# Altium footprint library Разъемы.PcbLib: 291 footprints (part 10 of 19)
Each footprint in its own frame and in the unit in brackets; x right, y up, seen from the top. Pads: shape width x height; smd on the part's side, far side on the other; paste and mask are expansions set on the pad; w line width, h text height; cw(c..) or ccw(c..) is an arc to the next point about the centre after c.
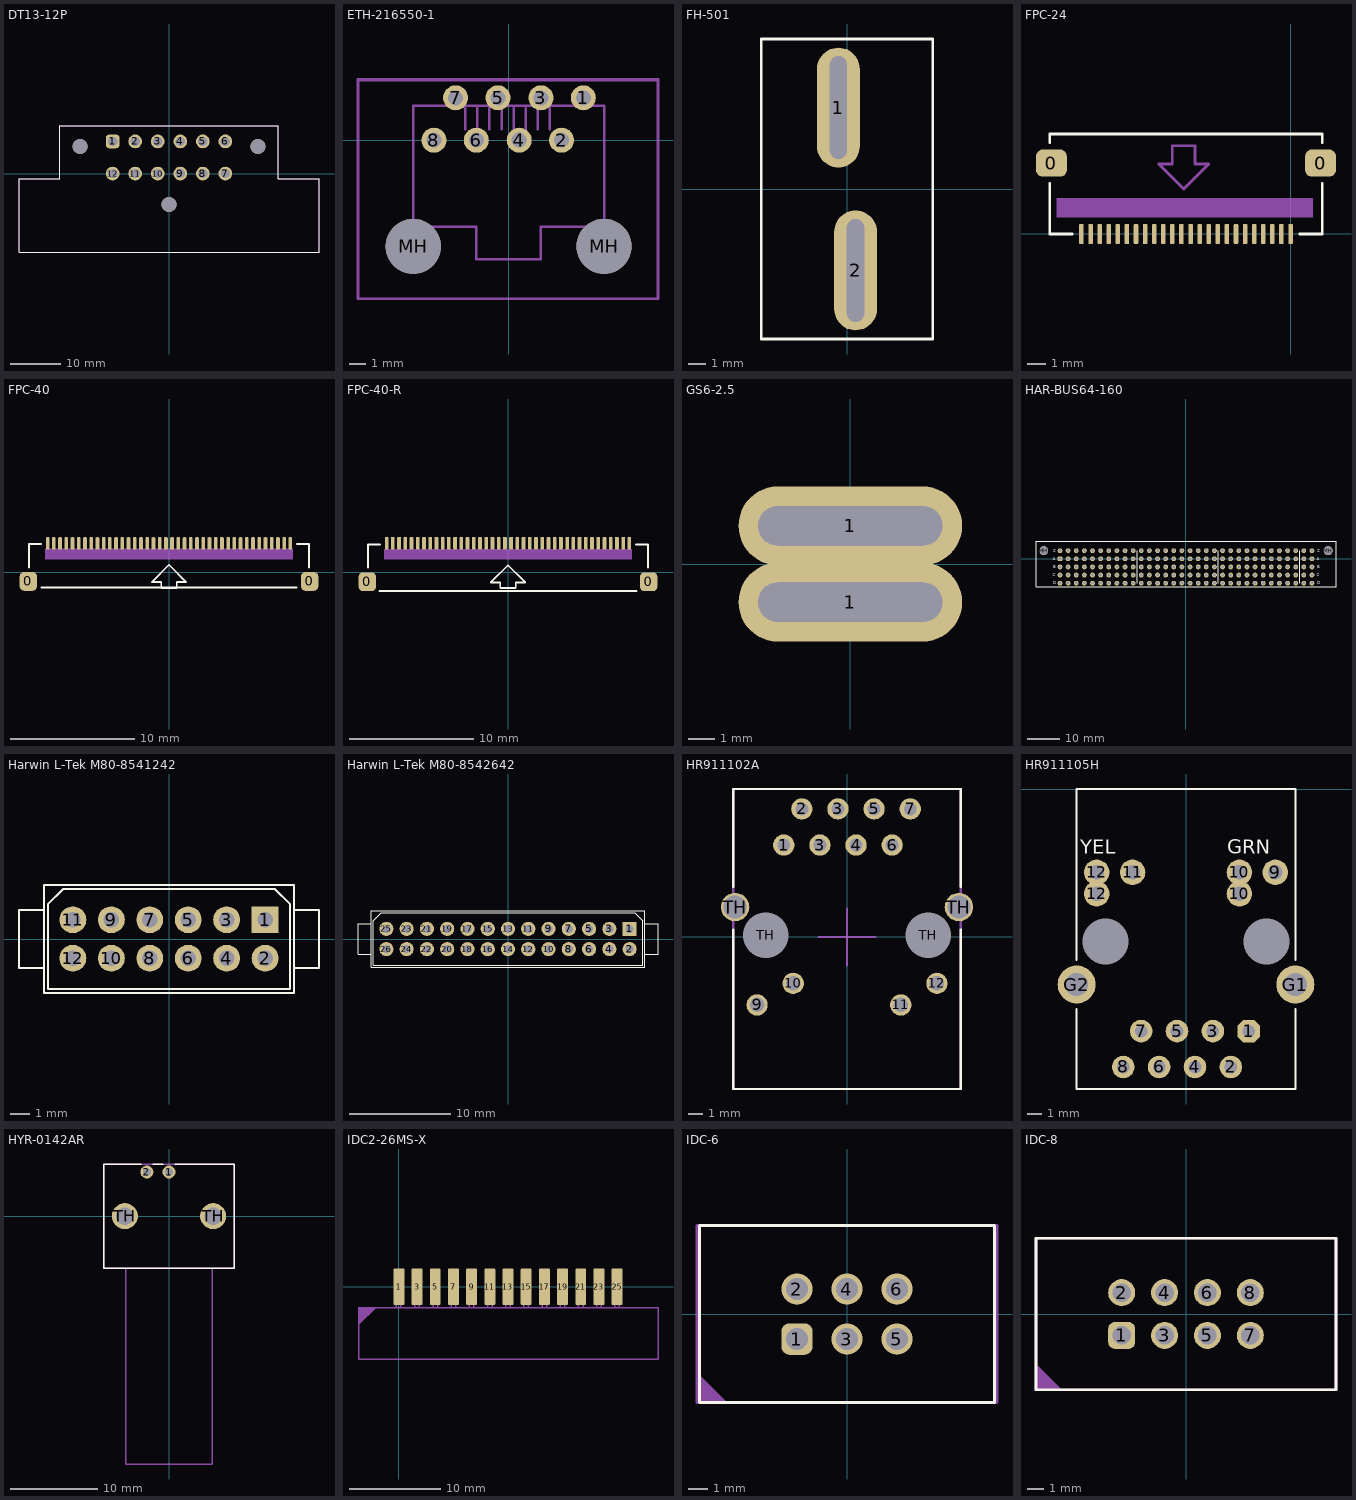
[diagram p9: the footprints below, top view; thin cyan lines are the x and y axes]

## DT13-12P [mm]
pads (15):
  rrect50% 2.715x2.715 hole 1.81: 1(-11.115,6.35)
  round 2.715 hole 1.81: 2(-6.67,6.35) 3(-2.225,6.35) 4(2.225,6.35) 5(6.67,6.35) 6(11.115,6.35) 7(11.115,0) 8(6.67,0) 9(2.225,0) 10(-2.225,0) 11(-6.67,0) 12(-11.115,0)
  round 2.99 hole 2.99 unplated: ""(-17.54,5.34) ""(0,-6.1) ""(17.54,5.34)
Top Overlay:
  lines w0.15: -29.605,-15.49 -29.605,-1 -21.605,-1 -21.605,9.4 21.605,9.4 21.605,-1 29.605,-1 29.605,-15.49 20.28,-15.49 -20.28,-15.49 -29.605,-15.49
  text "." at -11.521,10.029 h0.1
Top Courtyard:
  lines w0.127: -29.605,-15.49 -29.605,-1 -21.605,-1 -21.605,9.4 21.605,9.4 21.605,-1 29.605,-1 29.605,-15.49 20.28,-15.49 -20.28,-15.49 -29.605,-15.49
Top Designator:
  text ".Designator" at -3.999,-10.153 h0.8
3D body "c-dt13-12pb-d-3d.stp": height 33.65, standoff -4.98, extent -29.577,-30.312 29.605,9.312

## ETH-216550-1 [mm]
pads (10):
  round 1.5 hole 0.9: 1(4.475,2.54) 2(3.175,0) 3(1.935,2.54) 4(0.635,0) 5(-0.635,2.54) 6(-1.935,0) 7(-3.175,2.54) 8(-4.475,0)
  round 3.3 hole 3.3 unplated: MH(-5.715,-6.36) MH(5.715,-6.36)
Top Designator:
  text ".Designator" at -4.036,-3.217 h0.8
Mechanical 29:
  lines w0.15: -2.6,0.65 -2.6,1.925 ; -1.875,0.65 -1.875,1.925 ; -1.15,0.65 -1.15,1.925 ; -0.425,0.65 -0.425,1.925 ; 0.3,0.65 0.3,1.925 ; 1.025,0.65 1.025,1.925 ; 1.75,0.65 1.75,1.925 ; 2.475,0.65 2.475,1.925 ; -9.025,-9.5 8.95,-9.5 ; -9.025,-9.5 -9.025,3.6 8.95,3.6 8.95,-9.5 ; -9.025,-9.5 8.95,-9.5 ; -9.025,-9.5 -9.025,3.65 8.95,3.65 8.95,-9.5 ; -5.715,-5.2 -1.935,-5.2 -1.935,-7.125 1.935,-7.125 1.935,-5.2 5.715,-5.2 5.715,2.05 -5.715,2.05 -5.715,-5.2
  text ".Designator" at -3.5,-2.8 h1
3D body "c-216550-1.STEP": height 16.5, standoff -3.1, extent -9.05,-9.625 8.95,3.075

## FH-501 [mm]
pads (2):
  oval 2.5x7 hole 6 slot 1 at 0 deg: 1(-0.5,4.75) 2(0.5,-4.75)
Top Overlay:
  lines w0.15: -5,-8.75 -5,8.75 5,8.75 5,-8.75 -5,-8.75
Top Designator:
  text ".Designator" at -3.999,-0.017 h0.8
3D body "FH-501.stp": height 15, standoff -7, extent -5,-18.5 5,19

## FPC-24 [mm]
pads (26):
  rrect50% 1.7x1.5 smd: 0(-13.15,3.9) 0(1.65,3.9)
  rrect50% 0.25x1.1 smd: 1(0,0) 2(-0.5,0) 3(-1,0) 4(-1.5,0) 5(-2,0) 6(-2.5,0) 7(-3,0) 8(-3.5,0) 9(-4,0) 10(-4.5,0) 11(-5,0) 12(-5.5,0) 13(-6,0) 14(-6.5,0) 15(-7,0) 16(-7.5,0) 17(-8,0) 18(-8.5,0) 19(-9,0) 20(-9.5,0) 21(-10,0) 22(-10.5,0) 23(-11,0) 24(-11.5,0)
Top Overlay:
  lines w0.15: -13.25,2.773 -13.25,0 -12.002,0 ; -13.25,5.027 -13.25,5.5 1.75,5.5 1.75,5.027 ; 0.502,0 1.75,0 1.75,2.773
  text "." at 0.75,-0.75 h0.1
Mechanical 29:
  rectangle: -12.875,0.9 1.225,1.975
  lines w0.15: -7.25,3.85 -6.5,3.85 ; -7.25,3.85 -5.875,2.475 ; -7.25,3.85 -6.5,3.85 ; -7.25,3.85 -5.875,2.475 ; -6.5,3.85 -6.5,4.85 ; -6.5,3.85 -6.5,4.85 ; -6.5,4.85 -5.25,4.85 ; -6.5,4.85 -5.25,4.85 ; -5.875,2.475 -4.5,3.85 ; -5.875,2.475 -4.5,3.85 ; -5.25,3.85 -4.5,3.85 ; -5.25,3.85 -5.25,4.85 ; -5.25,3.85 -4.5,3.85 ; -5.25,3.85 -5.25,4.85

## FPC-40 [mm]
pads (42):
  rrect50% 1.4x1.5 smd: 0(-11.3,-0.75) 0(11.3,-0.75)
  rrect50% 0.3x1 smd: 1(-9.75,2.3) 2(-9.25,2.3) 3(-8.75,2.3) 4(-8.25,2.3) 5(-7.75,2.3) 6(-7.25,2.3) 7(-6.75,2.3) 8(-6.25,2.3) 9(-5.75,2.3) 10(-5.25,2.3) 11(-4.75,2.3) 12(-4.25,2.3) 13(-3.75,2.3) 14(-3.25,2.3) 15(-2.75,2.3) 16(-2.25,2.3) 17(-1.75,2.3) 18(-1.25,2.3) 19(-0.75,2.3) 20(-0.25,2.3) 21(0.25,2.3) 22(0.75,2.3) 23(1.25,2.3) 24(1.75,2.3) 25(2.25,2.3) 26(2.75,2.3) 27(3.25,2.3) 28(3.75,2.3) 29(4.25,2.3) 30(4.75,2.3) 31(5.25,2.3) 32(5.75,2.3) 33(6.25,2.3) 34(6.75,2.3) 35(7.25,2.3) 36(7.75,2.3) 37(8.25,2.3) 38(8.75,2.3) 39(9.25,2.3) 40(9.75,2.3)
Top Overlay:
  lines w0.15: -11.25,0.377 -11.25,2.25 -10.277,2.25 ; -10.23,-1.25 10.23,-1.25 ; 10.277,2.25 11.25,2.25 11.25,0.377 ; -1.375,-0.8 0,0.575 ; -1.375,-0.8 -0.625,-0.8 ; -1.375,-0.8 -0.625,-0.8 ; -1.375,-0.8 0,0.575 ; -0.625,-0.8 -0.625,-1.25 0.625,-1.25 0.625,-0.8 ; -0.625,-0.8 -0.625,-1.275 0.625,-1.275 0.625,-0.8 ; 0,0.575 1.375,-0.8 ; 0,0.575 1.375,-0.8 ; 0.625,-0.8 1.375,-0.8 ; 0.625,-0.8 1.375,-0.8
  text "." at -10.5,2.75 h0.1
Mechanical 29:
  region: 9.95,1.9 -9.975,1.9 -9.975,1.025 9.95,1.025
3D body "FPC-40.STEP": height 1.2, standoff -0.02, extent -11.025,-0.95 10.975,2.05

## FPC-40-R [mm]
pads (42):
  rrect50% 1.4x1.5 smd: 0(-11.3,-0.75) 0(11.3,-0.75)
  rrect50% 0.3x1 smd: 1(9.75,2.35) 2(9.25,2.35) 3(8.75,2.35) 4(8.25,2.35) 5(7.75,2.35) 6(7.25,2.35) 7(6.75,2.35) 8(6.25,2.35) 9(5.75,2.35) 10(5.25,2.35) 11(4.75,2.35) 12(4.25,2.35) 13(3.75,2.35) 14(3.25,2.35) 15(2.75,2.35) 16(2.25,2.35) 17(1.75,2.35) 18(1.25,2.35) 19(0.75,2.35) 20(0.25,2.35) 21(-0.25,2.35) 22(-0.75,2.35) 23(-1.25,2.35) 24(-1.75,2.35) 25(-2.25,2.35) 26(-2.75,2.35) 27(-3.25,2.35) 28(-3.75,2.35) 29(-4.25,2.35) 30(-4.75,2.35) 31(-5.25,2.35) 32(-5.75,2.35) 33(-6.25,2.35) 34(-6.75,2.35) 35(-7.25,2.35) 36(-7.75,2.35) 37(-8.25,2.35) 38(-8.75,2.35) 39(-9.25,2.35) 40(-9.75,2.35)
Top Overlay:
  lines w0.15: -11.25,0.377 -11.25,2.25 -10.277,2.25 ; -10.313,-1.5 10.313,-1.5 ; 10.277,2.25 11.25,2.25 11.25,0.377 ; -1.375,-0.8 0,0.575 ; -1.375,-0.8 0,0.575 ; -1.375,-0.8 -0.625,-0.8 ; -1.375,-0.8 -0.625,-0.8 ; -0.625,-0.8 -0.625,-1.25 0.625,-1.25 0.625,-0.8 ; -0.625,-0.8 -0.625,-1.275 0.625,-1.275 0.625,-0.8 ; 0,0.575 1.375,-0.8 ; 0,0.575 1.375,-0.8 ; 0.625,-0.8 1.375,-0.8 ; 0.625,-0.8 1.375,-0.8
  text "." at 10.5,3 h0.1
Mechanical 29:
  region: 9.95,1.9 -9.975,1.9 -9.975,1.025 9.95,1.025
3D body "FPC-40.STEP": height 1.2, standoff -0.02, extent -11.025,-0.95 10.975,2.05

## GS6-2.5 [mm]
pads (2):
  oval 8.5x3 hole 1.5 slot 7 at 0 deg: 1(0,-1.45) 1(0,1.45)
Top Designator:
  text ".Designator" at -10.073,-0.266 h0.8
Multi-Layer:
  pour cut-out: -4.5,3 -3,3 -3,-3 -4.5,-3
3D body "GS6-2.5.STEP": height 1.15, standoff -2.75, extent -16.5,-5 2.5,5

## HAR-BUS64-160 [mm] "HAR-BUS64-160"
pads (162):
  rrect50% 1.5x1.5 hole 0.9: A1(-39.37,0)
  round 1.5 hole 0.9: A2(-36.83,0) A3(-34.29,0) A4(-31.75,0) A5(-29.21,0) A6(-26.67,0) A7(-24.13,0) A8(-21.59,0) A9(-19.05,0) A10(-16.51,0) A11(-13.97,0) A12(-11.43,0) A13(-8.89,0) A14(-6.35,0) A15(-3.81,0) A16(-1.27,0) A17(1.27,0) A18(3.81,0) A19(6.35,0) A20(8.89,0) A21(11.43,0) A22(13.97,0) A23(16.51,0) A24(19.05,0) A25(21.59,0) A26(24.13,0) A27(26.67,0) A28(29.21,0) A29(31.75,0) A30(34.29,0) A31(36.83,0) A32(39.37,0) B1(-39.37,-2.54) B2(-36.83,-2.54) B3(-34.29,-2.54) B4(-31.75,-2.54) B5(-29.21,-2.54) B6(-26.67,-2.54) B7(-24.13,-2.54) B8(-21.59,-2.54) B9(-19.05,-2.54) B10(-16.51,-2.54) B11(-13.97,-2.54) B12(-11.43,-2.54) B13(-8.89,-2.54) B14(-6.35,-2.54) B15(-3.81,-2.54) B16(-1.27,-2.54) B17(1.27,-2.54) B18(3.81,-2.54) B19(6.35,-2.54) B20(8.89,-2.54) B21(11.43,-2.54) B22(13.97,-2.54) B23(16.51,-2.54) B24(19.05,-2.54) B25(21.59,-2.54) B26(24.13,-2.54) B27(26.67,-2.54) B28(29.21,-2.54) B29(31.75,-2.54) B30(34.29,-2.54) B31(36.83,-2.54) B32(39.37,-2.54) C1(-39.37,-5.08) C2(-36.83,-5.08) C3(-34.29,-5.08) C4(-31.75,-5.08) C5(-29.21,-5.08) C6(-26.67,-5.08) C7(-24.13,-5.08) C8(-21.59,-5.08) C9(-19.05,-5.08) C10(-16.51,-5.08) C11(-13.97,-5.08) C12(-11.43,-5.08) C13(-8.89,-5.08) C14(-6.35,-5.08) C15(-3.81,-5.08) C16(-1.27,-5.08) C17(1.27,-5.08) C18(3.81,-5.08) C19(6.35,-5.08) C20(8.89,-5.08) C21(11.43,-5.08) C22(13.97,-5.08) C23(16.51,-5.08) C24(19.05,-5.08) C25(21.59,-5.08) C26(24.13,-5.08) C27(26.67,-5.08) C28(29.21,-5.08) C29(31.75,-5.08) C30(34.29,-5.08) C31(36.83,-5.08) C32(39.37,-5.08) D1(-39.37,-7.62) D2(-36.83,-7.62) D3(-34.29,-7.62) D4(-31.75,-7.62) D5(-29.21,-7.62) D6(-26.67,-7.62) D7(-24.13,-7.62) D8(-21.59,-7.62) D9(-19.05,-7.62) D10(-16.51,-7.62) D11(-13.97,-7.62) D12(-11.43,-7.62) D13(-8.89,-7.62) D14(-6.35,-7.62) D15(-3.81,-7.62) D16(-1.27,-7.62) D17(1.27,-7.62) D18(3.81,-7.62) D19(6.35,-7.62) D20(8.89,-7.62) D21(11.43,-7.62) D22(13.97,-7.62) D23(16.51,-7.62) D24(19.05,-7.62) D25(21.59,-7.62) D26(24.13,-7.62) D27(26.67,-7.62) D28(29.21,-7.62) D29(31.75,-7.62) D30(34.29,-7.62) D31(36.83,-7.62) D32(39.37,-7.62) Z1(-39.37,2.54) Z2(-36.83,2.54) Z3(-34.29,2.54) Z4(-31.75,2.54) Z5(-29.21,2.54) Z6(-26.67,2.54) Z7(-24.13,2.54) Z8(-21.59,2.54) Z9(-19.05,2.54) Z10(-16.51,2.54) Z11(-13.97,2.54) Z12(-11.43,2.54) Z13(-8.89,2.54) Z14(-6.35,2.54) Z15(-3.81,2.54) Z16(-1.27,2.54) Z17(1.27,2.54) Z18(3.81,2.54) Z19(6.35,2.54) Z20(8.89,2.54) Z21(11.43,2.54) Z22(13.97,2.54) Z23(16.51,2.54) Z24(19.05,2.54) Z25(21.59,2.54) Z26(24.13,2.54) Z27(26.67,2.54) Z28(29.21,2.54) Z29(31.75,2.54) Z30(34.29,2.54) Z31(36.83,2.54) Z32(39.37,2.54)
  round 2.8 hole 2.8 unplated mask+0.102: MH(-44.45,2.54) MH(44.45,2.54)
Top Overlay:
  lines w0.15: -15.24,-7.62 -15.24,2.54 ; 10.16,-7.62 10.16,2.54 ; 35.56,-7.62 35.56,2.54 ; -46.87,-8.75 -46.87,5.5 46.88,5.5 46.88,-8.75 -46.87,-8.75
  text "Z" at 40.95,2.05 h0.9
  text "D" at 40.95,-7.95 h0.9
  text "C" at 40.929,-5.45 h0.9
  text "B" at 40.95,-2.95 h0.9
  text "A" at 40.907,-0.45 h0.9
  text "Z" at -41.55,2.05 h0.9
  text "D" at -41.55,-7.95 h0.9
  text "C" at -41.571,-5.45 h0.9
  text "B" at -41.55,-2.95 h0.9
  text "A" at -41.593,-0.45 h0.9
  text "." at -40,-9.5 h0.1
Top Designator:
  text ".Designator" at -4.014,1.129 h0.8
3D body "СНП350-160ВП31.STEP": height 9.5, standoff -2.82, extent -47.015,-7.873 46.985,12.801

## Harwin L-Tek M80-8541242 [mm]
height 5.56
pads (12):
  rect 1.4x1.4 hole 0.8: 1(5,1)
  round 1.4 hole 0.8: 2(5,-1) 3(3,1) 4(3,-1) 5(1,1) 6(1,-1) 7(-1,1) 8(-1,-1) 9(-3,1) 10(-3,-1) 11(-5,1) 12(-5,-1)
Top Overlay:
  lines w0.1: -6.5,-1.5 -7.8,-1.5 -7.8,1.5 -6.5,1.5 ; 6.5,-1.5 7.8,-1.5 7.8,1.5 6.5,1.5 ; -6.5,-2.8 -6.5,2.8 6.5,2.8 6.5,-2.8 -6.5,-2.8 ; -6.3,-2.6 6.3,-2.6 6.3,1.8 5.5,2.6 -5.5,2.6 -6.3,1.8 -6.3,-2.6

## Harwin L-Tek M80-8542642 [mm]
height 5.56
pads (26):
  rect 1.4x1.4 hole 0.8: 1(12,1)
  round 1.4 hole 0.8: 2(12,-1) 3(10,1) 4(10,-1) 5(8,1) 6(8,-1) 7(6,1) 8(6,-1) 9(4,1) 10(4,-1) 11(2,1) 12(2,-1) 13(0,1) 14(0,-1) 15(-2,1) 16(-2,-1) 17(-4,1) 18(-4,-1) 19(-6,1) 20(-6,-1) 21(-8,1) 22(-8,-1) 23(-10,1) 24(-10,-1) 25(-12,1) 26(-12,-1)
Top Overlay:
  lines w0.1: -13.5,-1.5 -14.8,-1.5 -14.8,1.5 -13.5,1.5 ; 13.5,-1.5 14.8,-1.5 14.8,1.5 13.5,1.5 ; -13.5,-2.8 13.5,-2.8 13.5,2.8 -13.5,2.8 -13.5,-2.8 ; -13.3,-2.6 -13.3,1.8 -12.5,2.6 12.5,2.6 13.3,1.8 13.3,-2.6 -13.3,-2.6

## HR911102A [mm]
height 14
pads (16):
  round 1.5 hole 0.9: 1(-4.445,6.46) 2(-3.175,9) 3(-1.905,6.46) 3(-0.635,9) 4(0.635,6.46) 5(1.905,9) 6(3.175,6.46) 7(4.445,9)
  round 1.5 hole 1.02: 9(-6.325,-4.79) 10(-3.785,-3.27) 11(3.785,-4.79) 12(6.325,-3.27)
  round 2 hole 1.6: TH(-7.875,2.1) TH(7.875,2.1)
  round 1.5 hole 3.2 unplated: TH(-5.715,0.11) TH(5.715,0.11)
Top Overlay:
  lines w0.15: -8,0.5 -8,-10.7 8,-10.7 8,0.5 ; -8,3.5 -8,10.4 8,10.4 8,3.5
Top Designator:
  text ".Designator" at -3.999,-0.479 h0.8
Mechanical 15:
  lines w0.15: -2,0 2,0 ; 0,-2 0,2
Mechanical 29:
  lines w0.15: -8,-10.7 8,-10.7 8,10.4 -8,10.4 -8,-10.7
  text ".Designator" at -3.5,-0.8 h1
3D body: height 4, standoff 1.5, extent 3,-10.9 6.5,-10.4
3D body: height 4, standoff 1.5, extent -6.5,-10.9 -3,-10.4
3D body: height 14, standoff 0.5, extent -8.075,-10.775 8.075,10.475

## HR911105H [mm] "TRJ0011GBNL -- CONN RJ45  WITH MAGNETIC AND LEDS"
height 13.45
pads (18):
  oct 1.6x1.6 hole 0.9: 1(4.445,-17.15)
  round 1.6 hole 0.9: 2(3.175,-19.69) 3(1.905,-17.15) 4(0.635,-19.69) 5(-0.635,-17.15) 6(-1.905,-19.69) 7(-3.175,-17.15) 8(-4.445,-19.69)
  round 1.8 hole 1.02: 9(6.325,-5.9) 10(3.785,-7.42) 10(3.785,-5.9) 11(-3.785,-5.9) 12(-6.325,-7.42) 12(-6.325,-5.9)
  round 2.7 hole 1.63: G1(7.745,-13.85) G2(-7.745,-13.85)
  round 0 hole 3.25: ""(-5.715,-10.8) ""(5.715,-10.8)
Top Overlay:
  lines w0.15: -7.75,-15.577 -7.75,-21.25 7.75,-21.25 7.75,-15.577 ; -7.75,-12.123 -7.75,0 7.75,0 7.75,-12.123
  text "GRN" at 2.921,-4.572 h1.02
  text "YEL" at -7.493,-4.572 h1.02
Top Designator:
  text ".Designator" at -3.999,-11.142 h0.8
Mechanical 29:
  text ".Designator" at -3.5,-12.8 h1
3D body "User Library-bothhandusalu1t516-43-lf.step": height 13.32, standoff -3.71, extent -7.67,-21.325 7.57,-0.025

## HYR-0142AR [mm]
pads (4):
  round 1.5 hole 0.9: 1(0,5.08) 2(-2.54,5.08)
  round 3 hole 2: TH(-5.08,0) TH(5.08,0)
Top Overlay:
  lines w0.15: -3.19,6 -7.5,6 -7.5,-6 7.5,-6 7.5,6 0.65,6 ; -1.89,6 -0.65,6
Mechanical 29:
  lines w0.15: -5,-6 -5,-28.5 5,-28.5 5,-6 ; -7.5,-6 -7.5,6 7.5,6 7.5,-6 -7.5,-6
3D body "HYR-0142AR.STEP": height 12.5, standoff -4, extent -7.35,-28.45 7.35,6.05

## IDC2-26MS-X [mm]
pads (13):
  rrect20% 1.2x4 smd: 1(0,0) 3(2,0) 5(4,0) 7(6,0) 9(8,0) 11(10,0) 13(12,0) 15(14,0) 17(16,0) 19(18,0) 21(20,0) 23(22,0) 25(24,0)
Mechanical 29:
  region: -4.4,-2.3 -2.5,-2.3 -4.4,-4.2
  lines w0.15: -4.5,-2.3 28.5,-2.3 ; 28.5,-2.3 -4.4,-2.3 -4.4,-8 28.5,-8 28.5,-2.3 ; -0.3,-2.3 -0.3,1.6 0.2,1.6 0.2,-2.3 -0.3,-2.3 ; 1.75,-2.3 2.25,-2.3 2.25,1.6 1.75,1.6 1.75,-2.3 ; 3.75,-2.3 4.25,-2.3 4.25,1.6 3.75,1.6 3.75,-2.3 ; 5.75,-2.3 6.25,-2.3 6.25,1.6 5.75,1.6 5.75,-2.3 ; 7.75,-2.3 8.25,-2.3 8.25,1.6 7.75,1.6 7.75,-2.3 ; 9.75,-2.3 10.25,-2.3 10.25,1.6 9.75,1.6 9.75,-2.3 ; 11.75,-2.3 12.25,-2.3 12.25,1.6 11.75,1.6 11.75,-2.3 ; 13.75,-2.3 14.25,-2.3 14.25,1.6 13.75,1.6 13.75,-2.3 ; 15.75,-2.3 16.25,-2.3 16.25,1.6 15.75,1.6 15.75,-2.3 ; 17.75,-2.3 18.25,-2.3 18.25,1.6 17.75,1.6 17.75,-2.3 ; 19.75,-2.3 20.25,-2.3 20.25,1.6 19.75,1.6 19.75,-2.3 ; 21.75,-2.3 22.25,-2.3 22.25,1.6 21.75,1.6 21.75,-2.3 ; 23.75,-2.3 23.75,1.6 24.25,1.6 24.25,-2.3 23.75,-2.3
3D body "User Library-BH2-xx.step": height 3.95, standoff -1.5, extent -4.525,-7.9 28.475,1.35

## IDC-6 [mm]
height 8
pads (6):
  rrect50% 1.6x1.6 hole 1.1: 1(-2.54,-1.27)
  round 1.6 hole 1.1: 2(-2.54,1.27) 3(0,-1.27) 4(0,1.27) 5(2.54,-1.27) 6(2.54,1.27)
Top Overlay:
  lines w0.15: -7.5,-4.5 7.5,-4.5 7.5,4.5 -7.5,4.5 -7.5,-4.5
Top Designator:
  text ".Designator" at -3.999,-0.267 h0.8
Mechanical 29:
  region: -7.62,-4.5 -7.62,-2.976 -6.096,-4.5
  lines w0.15: -7.62,-4.5 -7.62,4.5 7.62,4.5 7.62,-4.5 -7.62,-4.5
  text ".Designator" at -3.5,-0.3 h1
3D body: height 3, standoff 0, extent -7.5,-4.5 7.5,4.5
3D body: height 9, standoff 0, extent -7.5,-4.5 7.5,4.5
3D body "PLS-1.STEP": height 8.5, standoff -3, extent 1.27,-2.54 3.81,0
3D body "PLS-1.STEP": height 8.5, standoff -3, extent 1.27,0 3.81,2.54
3D body "PLS-1.STEP": height 8.5, standoff -3, extent -1.27,-2.54 1.27,0
3D body "PLS-1.STEP": height 8.5, standoff -3, extent -1.27,0 1.27,2.54
3D body "PLS-1.STEP": height 8.5, standoff -3, extent -3.81,0 -1.27,2.54
3D body "PLS-1.STEP": height 8.5, standoff -3, extent -3.81,-2.54 -1.27,0

## IDC-8 [mm]
height 8
pads (8):
  rrect50% 1.6x1.6 hole 1.1: 1(-3.81,-1.27)
  round 1.6 hole 1.1: 2(-3.81,1.27) 3(-1.27,-1.27) 4(-1.27,1.27) 5(1.27,-1.27) 6(1.27,1.27) 7(3.81,-1.27) 8(3.81,1.27)
Top Overlay:
  lines w0.15: -8.89,-4.5 -8.89,4.5 8.89,4.5 8.89,-4.5 -8.89,-4.5
Top Designator:
  text ".Designator" at -3.999,-0.267 h0.8
Mechanical 29:
  region: -8.89,-4.5 -8.89,-2.976 -7.366,-4.5
  lines w0.15: -8.89,-4.5 8.89,-4.5 8.89,4.5 -8.89,4.5 -8.89,-4.5
  text ".Designator" at -3,-0.3 h1
3D body "PLS-1.STEP": height 8.5, standoff -3, extent -5.08,-2.54 -2.54,0
3D body "PLS-1.STEP": height 8.5, standoff -3, extent -5.08,0 -2.54,2.54
3D body "PLS-1.STEP": height 8.5, standoff -3, extent -2.54,0 0,2.54
3D body "PLS-1.STEP": height 8.5, standoff -3, extent -2.54,-2.54 0,0
3D body "PLS-1.STEP": height 8.5, standoff -3, extent 0,0 2.54,2.54
3D body "PLS-1.STEP": height 8.5, standoff -3, extent 0,-2.54 2.54,0
3D body "PLS-1.STEP": height 8.5, standoff -3, extent 2.54,0 5.08,2.54
3D body "PLS-1.STEP": height 8.5, standoff -3, extent 2.54,-2.54 5.08,0
3D body: height 3, standoff 0, extent -9,-4.5 9,4.5
3D body: height 9, standoff 0, extent -9,-4.5 9,4.5